# Altium footprint library SwagePCB.PcbLib: 114 footprints (part 5 of 8)
Each footprint in its own frame and in the unit in brackets; x right, y up, seen from the top. Pads: shape width x height; smd on the part's side, far side on the other; paste and mask are expansions set on the pad; w line width, h text height; cw(c..) or ccw(c..) is an arc to the next point about the centre after c.
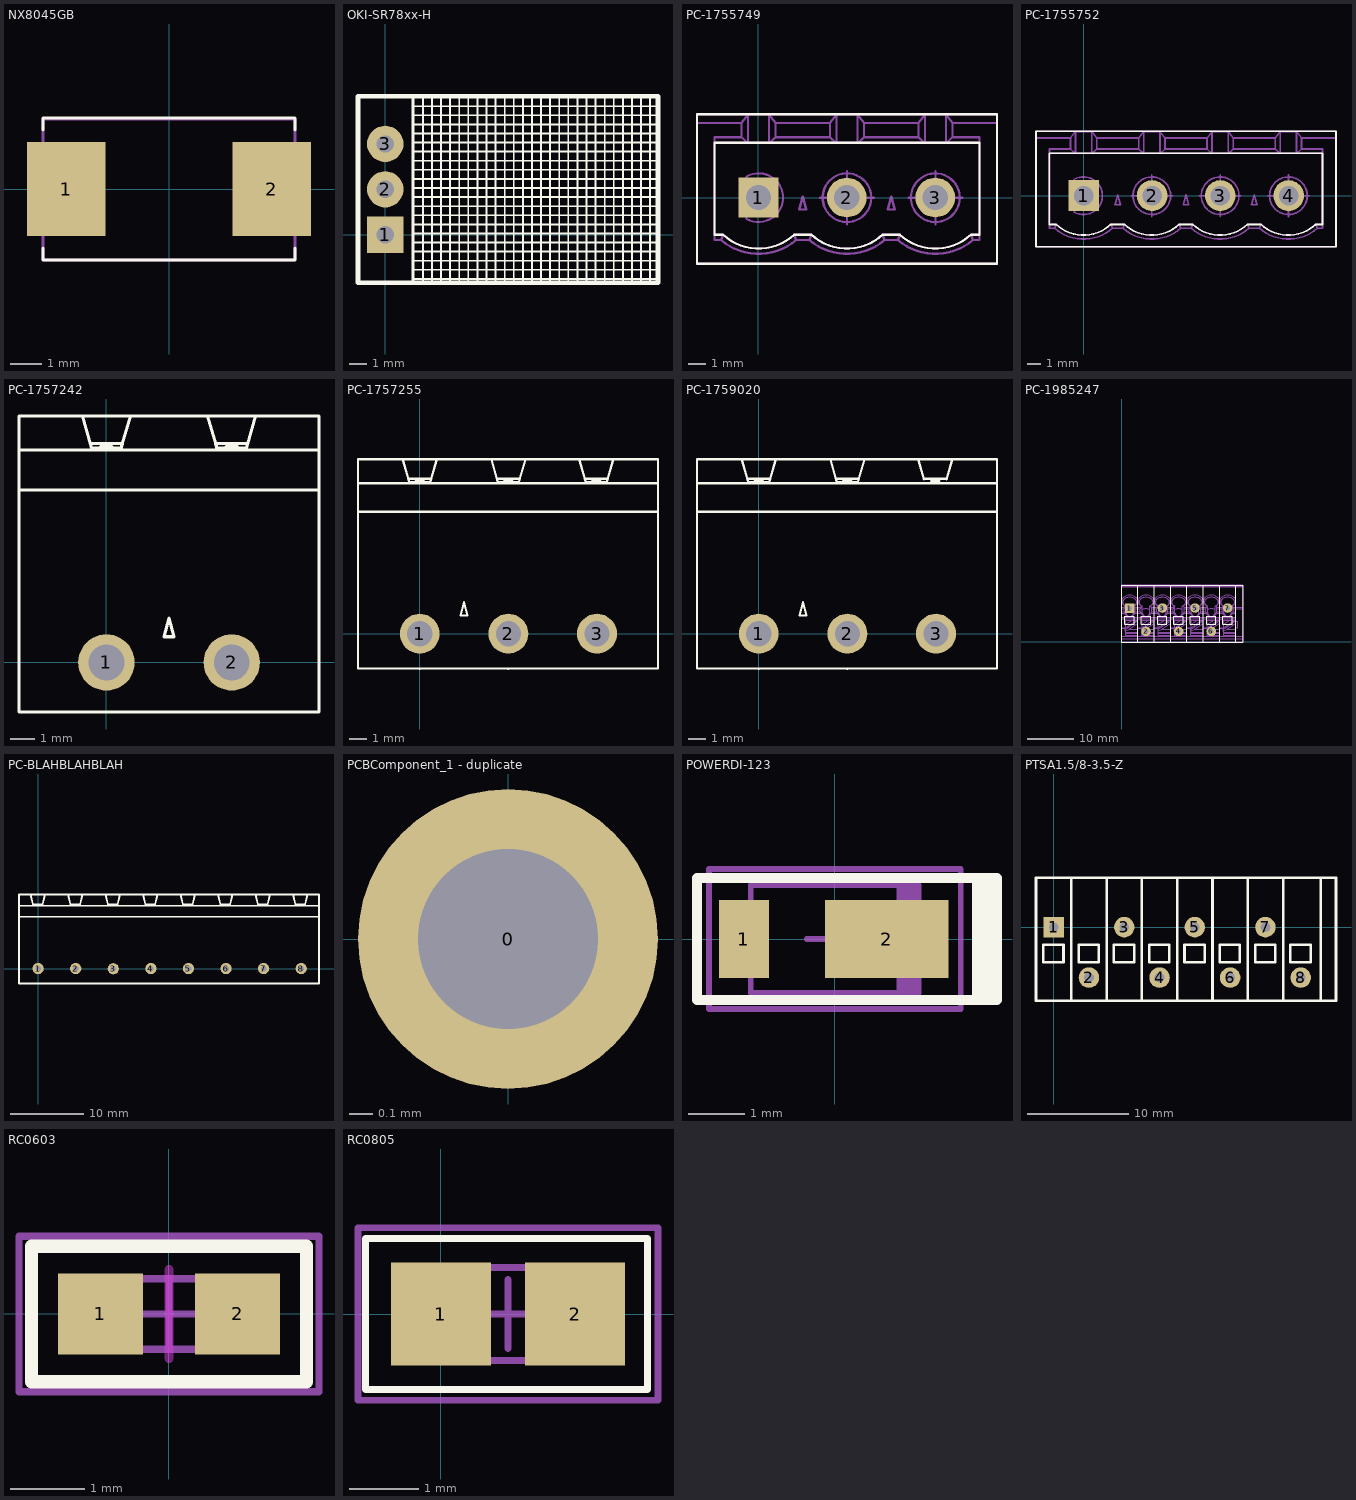
[diagram p4: the footprints below, top view; thin cyan lines are the x and y axes]

## NX8045GB [mm] "Crystal, 8MHz, SMD"
height 2
pads (2):
  rect 2.5x3 smd: 1(-3.263,0) 2(3.263,0)
Top Overlay:
  lines w0.102: -4,-1.875 -4,-2.25 4,-2.25 4,-1.875 ; -4,1.875 -4,2.25 4,2.25 4,1.875
Mechanical 13:
  lines w0.102: -4,-2.25 4,-2.25 ; -4,-2.25 -4,2.225 4,2.225 4,-2.25 ; -4,-2.25 4,-2.25
3D body: height 2, standoff 0.1, extent -4,-2.25 4,2.225

## OKI-SR78xx-H [mil] "Regulator, 3 Terminal, Switching, Horizontal Mount"
pads (3):
  rect 80x80 hole 38: 1(0,0)
  round 80 hole 38: 2(0,100) 3(0,200)
Top Overlay:
  lines w4: 60,-105 60,305 ; 60,-97 600,-97 ; 60,-77 600,-77 ; 60,-57 600,-57 ; 60,-37 600,-37 ; 60,-17 600,-17 ; 60,3 600,3 ; 60,23 600,23 ; 60,43 600,43 ; 60,63 600,63 ; 60,83 600,83 ; 60,103 600,103 ; 60,123 600,123 ; 60,143 600,143 ; 60,163 600,163 ; 60,183 600,183 ; 60,203 600,203 ; 60,223 600,223 ; 60,243 600,243 ; 60,263 600,263 ; 60,283 600,283 ; 60,303 600,303 ; 62.73,-103.44 62.73,306.56 ; 82.73,-103.44 82.73,306.56 ; 102.73,-103.44 102.73,306.56 ; 122.73,-103.44 122.73,306.56 ; 142.73,-103.44 142.73,306.56 ; 162.73,-103.44 162.73,306.56 ; 182.73,-103.44 182.73,306.56 ; 202.73,-103.44 202.73,306.56 ; 222.73,-103.44 222.73,306.56 ; 242.73,-103.44 242.73,306.56 ; 262.73,-103.44 262.73,306.56 ; 282.73,-103.44 282.73,306.56 ; 302.73,-103.44 302.73,306.56 ; 322.73,-103.44 322.73,306.56 ; 342.73,-103.44 342.73,306.56 ; 362.73,-103.44 362.73,306.56 ; 382.73,-103.44 382.73,306.56 ; 402.73,-103.44 402.73,306.56 ; 422.73,-103.44 422.73,306.56 ; 442.73,-103.44 442.73,306.56 ; 462.73,-103.44 462.73,306.56 ; 482.73,-103.44 482.73,306.56 ; 502.73,-103.44 502.73,306.56 ; 522.73,-103.44 522.73,306.56 ; 542.73,-103.44 542.73,306.56 ; 562.73,-103.44 562.73,306.56 ; 582.73,-103.44 582.73,306.56 ; 60,-103.44 600,-103.44 600,306.56 60,306.56 60,-103.44
  lines w10: -60,-105 600,-105 600,305 -60,305 -60,-105
3D body: height 300.47, standoff -169.53, extent -50,-105 600,305

## PC-1755749 [mil] "Connector, Phoenix Contact, 3 Position"
pads (3):
  rect 90x90 hole 57: 1(0,0)
  round 90 hole 57: 2(200,0) 3(400,0)
Top Overlay:
  lines w5: -24.98,124.15 -99.63,124.15 -99.63,-84.25 -79.93,-84.25 ccw(c0.37,2.36) 80.67,-84.25 120.07,-84.25 ccw(c200.37,2.36) 280.67,-84.25 320.07,-84.25 ccw(c400.37,2.36) 480.67,-84.25 500.37,-84.25 500.37,124.15 425.73,124.15 ; -23.45,124.15 24.19,124.15 ; 25.72,124.15 175.02,124.15 ; 176.55,124.15 224.19,124.15 ; 225.72,124.15 375.02,124.15 ; 376.55,124.15 424.19,124.15 ; -139,-150 539.74,-150 539.74,168.9 539.74,188.58 -139,188.58 -139,168.9 -139,-150
Mechanical 3:
  drawing of 723 lines, arcs and shapes, not listed
3D body: height 472.44, standoff -153.54, extent -139.37,-150 539.37,188.58

## PC-1755752 [mil] "Connector, Phoenix Contact, 4 Positions"
pads (4):
  rect 90x90 hole 57: 1(0,0)
  round 90 hole 57: 2(200,0) 3(400,0) 4(600,0)
Top Overlay:
  lines w5: -26.35,124 -101,124 -101,-84.4 -81.3,-84.4 ccw(c-1,2.21) 79.3,-84.4 118.7,-84.4 ccw(c199,2.21) 279.3,-84.4 318.7,-84.4 ccw(c399,2.21) 479.3,-84.4 518.7,-84.4 ccw(c599,2.21) 679.3,-84.4 699,-84.4 699,124 624.36,124 ; -24.82,124 22.82,124 ; 24.35,124 173.65,124 ; 175.18,124 222.82,124 ; 224.35,124 373.65,124 ; 375.18,124 422.82,124 ; 424.36,124 573.65,124 ; 575.18,124 622.82,124 ; -140,-150 -140,168.9 -140,188.58 738.74,188.58 738.74,168.9 738.74,-150 -140,-150
Mechanical 2:
  lines w5: 138.74,-0.39 260,-0.39 138.74,-0.39 ; 199.37,-61.02 199.37,60.24 199.37,-61.02 ; 338.74,-0.39 460,-0.39 338.74,-0.39 ; 399.37,-61.02 399.37,60.24 399.37,-61.02 ; 538.74,-0.39 660,-0.39 538.74,-0.39 ; 599.37,-61.02 599.37,60.24 599.37,-61.02
Mechanical 3:
  drawing of 925 lines, arcs and shapes, not listed
3D body: height 472.44, standoff -153.54, extent -140,-149.29 738.74,189.29

## PC-1757242 [mil] "Connector, 2 Pin, Right Angle, Phoenix Contact, PTH"
pads (2):
  round 90 hole 57: 1(0,0) 2(200,0)
Top Overlay:
  lines w5: -25.97,349.36 25.71,349.36 ; -9.79,342.26 -9.27,344.23 9.01,344.23 9.53,342.26 ; -1.99,-79 ccw(c-0.13,-59.44) 1.73,-79 ; 174.03,349.36 225.71,349.36 ; 190.21,342.26 190.73,344.23 209.01,344.23 209.53,342.26 ; 198.01,-79 ccw(c199.87,-59.44) 201.73,-79 ; -139.5,275.33 -139.5,52.89 -139.5,45.01 -139.5,40.11 -139.5,34.2 -139.5,15.93 -139.5,8.89 -139.5,7.39 -139.5,6.31 -139.5,2.98 -139.5,-5.28 -139.5,-8.61 -139.5,-9.69 -139.5,-11.19 -139.5,-11.66 -139.5,-18.23 -139.5,-47.24 -139.5,-51.43 -139.5,-59.31 -139.5,-79 -59.19,-79 58.93,-79 140.82,-79 258.93,-79 339.24,-79 339.24,41.08 339.24,70.61 339.24,275.33 ; -139.5,275.33 -139.5,339.36 ; -139.5,275.33 339.24,275.33 ; -139.5,339.36 339.24,339.36 ; -139.5,339.36 -139.5,393.44 -100.13,393.44 -84.94,393.44 -38.52,393.44 ; -38.52,393.44 -25.48,347.66 -23.95,342.26 23.69,342.26 25.22,347.66 38.26,393.44 ; -38.52,393.44 38.26,393.44 ; 38.26,393.44 84.68,393.44 115.06,393.44 161.48,393.44 ; 161.48,393.44 238.26,393.44 ; 161.48,393.44 174.52,347.66 176.05,342.26 223.69,342.26 225.22,347.66 238.26,393.44 ; 238.26,393.44 284.68,393.44 299.87,393.44 339.24,393.44 339.24,339.36 ; 339.24,275.33 339.24,339.36 ; 91.96,41.08 99.87,70.61 107.78,41.08 91.96,41.08
3D body: height 338.58, standoff -137.8, extent -139.87,-79.25 338.87,393.28

## PC-1757255 [mil] "Connector, 3 Pin, Right Angle, Phoenix Contact, PTH"
height 338.58
pads (3):
  round 90 hole 57: 1(0,0) 2(200,0) 3(400,0)
Top Overlay:
  lines w5: -25.97,349.36 25.71,349.36 ; -9.79,342.26 -9.27,344.23 9.01,344.23 9.53,342.26 ; -1.99,-79 ccw(c-0.13,-59.44) 1.73,-79 ; 174.03,349.36 225.71,349.36 ; 190.21,342.26 190.73,344.23 209.01,344.23 209.53,342.26 ; 198.01,-79 ccw(c199.87,-59.44) 201.73,-79 ; 313.49,393.44 359.91,393.44 ; 339.06,-79 457.17,-79 537.48,-79 ; 339.24,-79 258.93,-79 140.82,-79 58.93,-79 -59.19,-79 -139.5,-79 -139.5,-59.31 -139.5,-51.43 -139.5,-47.24 -139.5,-18.23 -139.5,-11.66 -139.5,-11.19 -139.5,-9.69 -139.5,-8.61 -139.5,-5.28 -139.5,2.98 -139.5,6.31 -139.5,7.39 -139.5,8.89 -139.5,15.93 -139.5,34.2 -139.5,40.11 -139.5,45.01 -139.5,52.89 -139.5,275.33 ; 339.24,393.44 299.87,393.44 284.68,393.44 238.26,393.44 ; 372.46,349.36 424.14,349.36 ; 388.63,342.26 389.16,344.23 407.43,344.23 407.96,342.26 ; 537.67,-79 537.67,41.08 537.67,70.61 537.67,275.33 ; -139.5,275.33 -139.5,339.36 ; -139.5,275.33 537.67,275.33 ; -139.5,339.36 -139.5,393.44 -100.13,393.44 -84.94,393.44 -38.52,393.44 ; -139.5,339.36 537.67,339.36 ; -38.52,393.44 38.26,393.44 ; -38.52,393.44 -25.48,347.66 -23.95,342.26 23.69,342.26 25.22,347.66 38.26,393.44 ; 38.26,393.44 84.68,393.44 115.06,393.44 161.48,393.44 ; 161.48,393.44 174.52,347.66 176.05,342.26 223.69,342.26 225.22,347.66 238.26,393.44 ; 161.48,393.44 238.26,393.44 ; 359.91,393.44 436.68,393.44 ; 359.91,393.44 372.94,347.66 374.48,342.26 422.11,342.26 423.65,347.66 436.68,393.44 ; 436.68,393.44 483.1,393.44 498.3,393.44 537.67,393.44 537.67,339.36 ; 537.67,275.33 537.67,339.36 ; 91.96,41.08 107.78,41.08 99.87,70.61 91.96,41.08
3D body: height 338.58, standoff -137.8, extent -137.64,-79 541.1,393.53

## PC-1759020 [mil] "Connector, 3 Pin, Right Angle, Phoenix Contact, PTH"
height 338.58
pads (3):
  round 90 hole 57: 1(0,0) 2(200,0) 3(400,0)
Top Overlay:
  lines w5: -25.97,349.36 25.71,349.36 ; -9.79,342.26 -9.27,344.23 9.01,344.23 9.53,342.26 ; -1.99,-79 ccw(c-0.13,-59.44) 1.73,-79 ; 174.03,349.36 225.71,349.36 ; 190.21,342.26 190.73,344.23 209.01,344.23 209.53,342.26 ; 198.01,-79 ccw(c199.87,-59.44) 201.73,-79 ; 313.49,393.44 359.91,393.44 ; 339.06,-79 457.17,-79 537.48,-79 ; 339.24,-79 258.93,-79 140.82,-79 58.93,-79 -59.19,-79 -139.5,-79 -139.5,-59.31 -139.5,-51.43 -139.5,-47.24 -139.5,-18.23 -139.5,-11.66 -139.5,-11.19 -139.5,-9.69 -139.5,-8.61 -139.5,-5.28 -139.5,2.98 -139.5,6.31 -139.5,7.39 -139.5,8.89 -139.5,15.93 -139.5,34.2 -139.5,40.11 -139.5,45.01 -139.5,52.89 -139.5,275.33 ; 339.24,393.44 299.87,393.44 284.68,393.44 238.26,393.44 ; 372.46,349.36 424.14,349.36 ; 372.94,347.66 359.91,393.44 ; 389.16,344.23 407.43,344.23 ; 423.65,347.66 436.68,393.44 ; 537.67,-79 537.67,41.08 537.67,70.61 537.67,275.33 ; -139.5,275.33 537.67,275.33 ; -139.5,275.33 -139.5,339.36 ; -139.5,339.36 537.67,339.36 ; -139.5,339.36 -139.5,393.44 -100.13,393.44 -84.94,393.44 -38.52,393.44 ; -38.52,393.44 -25.48,347.66 -23.95,342.26 23.69,342.26 25.22,347.66 38.26,393.44 ; -38.52,393.44 38.26,393.44 ; 38.26,393.44 84.68,393.44 115.06,393.44 161.48,393.44 ; 161.48,393.44 238.26,393.44 ; 161.48,393.44 174.52,347.66 176.05,342.26 223.69,342.26 225.22,347.66 238.26,393.44 ; 359.91,393.44 436.68,393.44 ; 436.68,393.44 483.1,393.44 498.3,393.44 537.67,393.44 537.67,339.36 ; 537.67,275.33 537.67,339.36 ; 91.96,41.08 99.87,70.61 107.78,41.08 91.96,41.08
3D body: height 338.58, standoff -137.8, extent -101.99,-79 498.01,393.53

## PC-1985247 [mil] "Connector, Spring, 7 positions"
pads (7):
  rect 80x80 hole 38: 1(68.9,285.59)
  round 80 hole 38: 2(206.69,88.74) 3(344.49,285.59) 4(482.28,88.74) 5(620.08,285.59) 6(757.87,88.74) 7(895.67,285.59)
Top Overlay:
  lines w10: 137.8,-1.81 137.8,478.51 ; 275.59,-1.81 275.59,478.51 ; 413.39,-1.81 413.39,478.51 ; 551.18,-1.81 551.18,478.51 ; 688.98,-1.81 688.98,478.51 ; 826.77,-1.81 826.77,478.51 ; 964.57,-1.81 964.57,478.51 ; 1023.62,-1.81 0,-1.81 0,478.51 1023.62,478.51 ; 1025.83,-1.81 1025.83,478.51 ; 28.54,148.78 107.28,148.78 107.28,217.68 28.54,217.68 28.54,148.78 ; 166.34,148.78 166.34,217.68 245.08,217.68 245.08,148.78 166.34,148.78 ; 304.13,148.78 304.13,217.68 382.87,217.68 382.87,148.78 304.13,148.78 ; 441.93,148.78 441.93,217.68 520.67,217.68 520.67,148.78 441.93,148.78 ; 579.72,148.78 579.72,217.68 658.46,217.68 658.46,148.78 579.72,148.78 ; 717.52,148.78 717.52,217.68 796.26,217.68 796.26,148.78 717.52,148.78 ; 855.32,148.78 855.32,217.68 934.06,217.68 934.06,148.78 855.32,148.78
Mechanical 3:
  drawing of 1178 lines, arcs and shapes, not listed
Mechanical 13:
  lines w3.94: 0,-1.79 1023.62,-1.79 1023.62,480.49 0,480.49 0,-1.81
3D body: height 515.75, standoff -137.8, extent 0,0 1023.62,472.44

## PC-BLAHBLAHBLAH [mil]
pads (8):
  round 60 hole 30: 1(0,0) 2(200,0) 3(400,-1) 4(600,0) 5(800,0) 6(1000,0) 7(1200,0) 8(1400,0)
Top Overlay:
  lines w9.98: -27.61,342.47 -21.98,342.47 ; -21.98,334.6 -21.98,342.47 ; -14.13,334.6 -14.13,342.47 ; 9.44,334.6 9.44,342.47 ; 17.3,334.6 17.3,342.47 ; 23.71,342.47 17.3,342.47 ; 171.93,342.47 177.56,342.47 ; 177.56,334.6 177.56,342.47 ; 185.42,334.6 185.42,342.47 ; 208.99,334.6 208.99,342.47 ; 216.84,334.6 216.84,342.47 ; 223.26,342.47 216.84,342.47 ; 371.47,342.47 377.1,342.47 ; 377.1,334.6 377.1,342.47 ; 384.96,334.6 384.96,342.47 ; 408.53,334.6 408.53,342.47 ; 416.38,334.6 416.38,342.47 ; 422.8,342.47 416.38,342.47 ; 571.02,342.47 576.65,342.47 ; 576.65,334.6 576.65,342.47 ; 584.5,334.6 584.5,342.47 ; 608.07,334.6 608.07,342.47 ; 615.93,334.6 615.93,342.47 ; 622.34,342.47 615.93,342.47 ; 770.56,342.47 776.19,342.47 ; 776.19,334.6 776.19,342.47 ; 784.05,334.6 784.05,342.47 ; 807.61,334.6 807.61,342.47 ; 815.47,334.6 815.47,342.47 ; 821.89,342.47 815.47,342.47 ; 970.1,342.47 975.73,342.47 ; 975.73,334.6 975.73,342.47 ; 983.59,334.6 983.59,342.47 ; 1007.16,334.6 1007.16,342.47 ; 1015.01,334.6 1015.01,342.47 ; 1021.43,342.47 1015.01,342.47 ; 1169.64,342.47 1175.28,342.47 ; 1175.28,334.6 1175.28,342.47 ; 1183.13,334.6 1183.13,342.47 ; 1206.7,334.6 1206.7,342.47 ; 1214.56,334.6 1214.56,342.47 ; 1220.97,342.47 1214.56,342.47 ; 1369.19,342.47 1374.82,342.47 ; 1374.82,334.6 1374.82,342.47 ; 1382.67,334.6 1382.67,342.47 ; 1406.24,334.6 1406.24,342.47 ; 1414.1,334.6 1414.1,342.47 ; 1420.51,342.47 1414.1,342.47 ; -101.72,275.55 -101.72,334.6 ; -101.72,275.55 1494.62,275.55 ; -101.72,275.55 -101.72,-78.74 1494.62,-78.74 1494.62,275.55 ; -101.72,334.6 -25.52,334.6 ; -101.72,334.6 -101.72,393.64 -41.23,393.64 ; -41.23,393.64 -25.52,334.6 ; -41.23,393.64 37.33,393.64 ; -25.52,334.6 21.62,334.6 ; -21.98,342.47 -14.13,342.47 ; -14.13,342.47 9.44,342.47 ; 9.44,342.47 17.3,342.47 ; 21.62,334.6 174.03,334.6 ; 21.62,334.6 37.33,393.64 ; 37.33,393.64 158.31,393.64 ; 158.31,393.64 174.03,334.6 ; 158.31,393.64 236.87,393.64 ; 174.03,334.6 221.16,334.6 ; 177.56,342.47 185.42,342.47 ; 185.42,342.47 208.99,342.47 ; 208.99,342.47 216.84,342.47 ; 221.16,334.6 373.57,334.6 ; 221.16,334.6 236.87,393.64 ; 236.87,393.64 357.86,393.64 ; 357.86,393.64 373.57,334.6 ; 357.86,393.64 436.42,393.64 ; 373.57,334.6 420.7,334.6 ; 377.1,342.47 384.96,342.47 ; 384.96,342.47 408.53,342.47 ; 408.53,342.47 416.38,342.47 ; 420.7,334.6 573.11,334.6 ; 420.7,334.6 436.42,393.64 ; 436.42,393.64 557.4,393.64 ; 557.4,393.64 573.11,334.6 ; 557.4,393.64 635.96,393.64 ; 573.11,334.6 620.25,334.6 ; 576.65,342.47 584.5,342.47 ; 584.5,342.47 608.07,342.47 ; 608.07,342.47 615.93,342.47 ; 620.25,334.6 772.65,334.6 ; 620.25,334.6 635.96,393.64 ; 635.96,393.64 756.94,393.64 ; 756.94,393.64 772.65,334.6 ; 756.94,393.64 835.5,393.64 ; 772.65,334.6 819.79,334.6 ; 776.19,342.47 784.05,342.47 ; 784.05,342.47 807.61,342.47 ; 807.61,342.47 815.47,342.47 ; 819.79,334.6 972.2,334.6 ; 819.79,334.6 835.5,393.64 ; 835.5,393.64 956.49,393.64 ; 956.49,393.64 972.2,334.6 ; 956.49,393.64 1035.05,393.64 ; 972.2,334.6 1019.33,334.6 ; 975.73,342.47 983.59,342.47 ; 983.59,342.47 1007.16,342.47 ; 1007.16,342.47 1015.01,342.47 ; 1019.33,334.6 1171.74,334.6 ; 1019.33,334.6 1035.05,393.64 ; 1035.05,393.64 1156.03,393.64 ; 1156.03,393.64 1171.74,334.6 ; 1156.03,393.64 1234.59,393.64 ; 1171.74,334.6 1218.88,334.6 ; 1175.28,342.47 1183.13,342.47 ; 1183.13,342.47 1206.7,342.47 ; 1206.7,342.47 1214.56,342.47 ; 1218.88,334.6 1371.28,334.6 ; 1218.88,334.6 1234.59,393.64 ; 1234.59,393.64 1355.57,393.64 ; 1355.57,393.64 1371.28,334.6 ; 1355.57,393.64 1434.13,393.64 ; 1371.28,334.6 1418.42,334.6 ; 1374.82,342.47 1382.67,342.47 ; 1382.67,342.47 1406.24,342.47 ; 1406.24,342.47 1414.1,342.47 ; 1418.42,334.6 1494.62,334.6 ; 1418.42,334.6 1434.13,393.64 ; 1434.13,393.64 1494.62,393.64 1494.62,334.6 ; 1494.62,275.55 1494.62,334.6
Mechanical 2:
  lines w9.98: -20.54,-10.98 -20.54,12.64 ; -18.8,-11.16 cw(c-11.8,-11.86) -12.69,-18.84 10.88,-18.85 cw(c11.73,-11.86) 18.71,-10.98 ; -18.8,12.48 ccw(c-11.8,11.82) -12.51,18.82 ; -12.69,20.51 10.88,20.51 ; 11.05,18.82 ccw(c11.73,11.82) 18.72,12.64 ; 18.74,-10.98 18.74,12.64 ; 179,-10.98 179,12.64 ; 180.7,-11.15 cw(c187.7,-11.86) 186.86,-18.85 210.43,-18.85 ; 180.7,12.48 ccw(c187.7,11.82) 187.02,18.82 ; 186.86,20.51 210.43,20.51 ; 210.42,-18.82 cw(c211.29,-11.86) 218.24,-10.99 ; 210.59,18.8 ccw(c211.29,11.82) 218.25,12.63 ; 218.28,-10.98 218.28,12.64 ; 378.54,-10.98 378.54,12.64 ; 380.31,-11.16 cw(c387.31,-11.86) 386.4,-18.84 409.97,-18.85 cw(c410.84,-11.86) 417.82,-10.98 417.82,12.64 ; 380.3,12.48 ccw(c387.31,11.82) 386.58,18.82 ; 386.4,20.51 409.97,20.51 ; 410.14,18.82 ccw(c410.84,11.82) 417.83,12.64 ; 578.09,-10.98 578.09,12.64 ; 579.81,-11.16 cw(c586.81,-11.86) 585.94,-18.84 609.51,-18.85 cw(c610.34,-11.86) 617.32,-10.99 ; 579.8,12.48 ccw(c586.81,11.82) 586.11,18.82 ; 585.94,20.51 609.51,20.51 ; 609.67,18.83 ccw(c610.34,11.82) 617.33,12.63 617.37,-10.98 ; 777.63,-10.98 777.63,12.64 ; 779.31,-11.15 cw(c786.31,-11.86) 785.48,-18.85 809.05,-18.85 cw(c809.94,-11.86) 816.92,-10.98 816.91,12.64 ; 779.3,12.48 ccw(c786.31,11.82) 785.64,18.83 ; 785.49,20.51 809.05,20.51 ; 809.23,18.82 ccw(c809.94,11.82) 816.93,12.64 ; 977.17,-10.98 977.17,12.64 ; 978.91,-11.16 cw(c985.91,-11.86) 985.03,-18.84 1008.6,-18.85 cw(c1009.45,-11.86) 1016.43,-10.99 1016.45,12.64 cw(c1009.45,11.82) 1008.76,18.82 ; 978.91,12.48 ccw(c985.91,11.82) 985.2,18.82 ; 985.03,20.51 1008.6,20.51 ; 1176.72,-10.98 1176.72,12.64 ; 1178.41,-11.15 cw(c1185.41,-11.86) 1184.57,-18.85 1208.14,-18.85 cw(c1209.05,-11.86) 1216.03,-10.98 ; 1178.41,12.48 ccw(c1185.41,11.82) 1184.73,18.82 ; 1184.57,20.51 1208.14,20.51 ; 1208.32,18.82 ccw(c1209.05,11.82) 1216.04,12.64 ; 1216,-10.98 1216,12.64 ; 1376.26,-10.98 1376.26,12.64 ; 1378.02,-11.16 cw(c1385.02,-11.86) 1384.11,-18.84 1407.68,-18.85 cw(c1408.55,-11.86) 1415.53,-10.98 1415.54,12.64 cw(c1408.55,11.82) 1407.85,18.82 ; 1378.01,12.48 ccw(c1385.02,11.82) 1384.29,18.82 ; 1384.11,20.51 1407.68,20.51

## PCBComponent_1 [mm]

## PCBComponent_1 - duplicate [mil]
pads (1):
  round 50 hole 30: 0(0,0)

## PCBComponent_1 - duplicate1 [mm]

## POWERDI-123 [mm] "Molded Diode, DFLS1200, 2-Leads, Body 2.8x1.8mm, IPC Medium Density"
height 1
pads (2):
  rect 0.9x1.4 smd: 1(-1.625,0)
  rect 2.2x1.4 smd: 2(0.925,0)
Top Overlay:
  lines w0.178: 2.54,-1.092 2.54,1.092 ; 2.692,1.092 2.896,1.092 2.896,-1.092 2.718,-1.092 -2.464,-1.092 -2.464,1.092 2.54,1.092 ; 2.718,-1.041 2.718,1.092 2.54,1.092
Mechanical 13:
  rectangle: 1.097,-0.965 1.5,0.965
  lines w0.1: -1.5,-0.965 -1.5,0.965 1.5,0.965 1.5,-0.965 -1.5,-0.965
Mechanical 15:
  lines w0.1: -0.5,0 0.5,0 ; 0,-0.5 0,0.5 ; -2.25,-1.25 -2.25,1.25 2.25,1.25 2.25,-1.25 -2.25,-1.25
3D body: height 1, standoff 0, extent -1.5,-0.965 1.5,0.965

## PTSA1.5/8-3.5-Z [mil] "Connector, ZIF, PC-1985250,"
height 515.75
pads (8):
  rect 80x80 hole 38: 1(0,0)
  round 80 hole 38: 2(137.8,-196.85) 3(275.59,0) 4(413.39,-196.85) 5(551.18,0) 6(688.98,-196.85) 7(826.77,0) 8(964.57,-196.85)
Top Overlay:
  lines w10: 68.9,-287.4 68.9,192.91 ; 206.69,-287.4 206.69,192.91 ; 344.49,-287.4 344.49,192.91 ; 482.28,-287.4 482.28,192.91 ; 620.08,-287.4 620.08,192.91 ; 757.87,-287.4 757.87,192.91 ; 895.67,-287.4 895.67,192.91 ; 1043.31,-287.4 1043.31,192.91 ; -68.9,-287.4 -68.9,192.91 1102.36,192.91 1102.36,-287.4 -68.9,-287.4 ; -40.35,-136.81 -40.35,-67.91 38.39,-67.91 38.39,-136.81 -40.35,-136.81 ; 97.44,-136.81 176.18,-136.81 176.18,-67.91 97.44,-67.91 97.44,-136.81 ; 235.24,-136.81 313.98,-136.81 313.98,-67.91 235.24,-67.91 235.24,-136.81 ; 373.03,-136.81 451.77,-136.81 451.77,-67.91 373.03,-67.91 373.03,-136.81 ; 510.83,-136.81 589.57,-136.81 589.57,-67.91 510.83,-67.91 510.83,-136.81 ; 648.62,-136.81 727.36,-136.81 727.36,-67.91 648.62,-67.91 648.62,-136.81 ; 786.42,-136.81 865.16,-136.81 865.16,-67.91 786.42,-67.91 786.42,-136.81 ; 924.21,-136.81 1002.95,-136.81 1002.95,-67.91 924.21,-67.91 924.21,-136.81
Mechanical 13:
  lines w3.94: -68.9,-287.4 -68.9,194.9 1102.36,194.9 1102.36,-287.39 -68.9,-287.39
3D body: height 515.75, standoff -137.8, extent -68.9,-287.4 1092.52,185.04

## RC0603 [mm] "Resistor, Capacitor, 0603"
height 0.55
pads (2):
  rect 1.15x1.1 smd: 1(-0.925,0) 2(0.925,0)
Top Layer keep-out:
  lines w0.127: 0,-0.6 0,0.6
Top Overlay:
  lines w0.178: -1.854,-0.914 1.854,-0.914 1.854,0.914 -1.854,0.914 -1.854,-0.914
Mechanical 13:
  lines w0.1: -0.875,-0.475 0.875,-0.475 0.875,0.475 -0.875,0.475 -0.875,-0.475
Mechanical 15:
  lines w0.1: -0.475,0 0.475,0 ; 0,-0.475 0,0.475 ; -2.025,-1.05 2.025,-1.05 2.025,1.05 -2.025,1.05 -2.025,-1.05
3D body: height 0.55, standoff 0, extent -0.875,-0.475 0.875,0.475

## RC0805 [mm]
height 0.5
pads (2):
  rect 1.45x1.5 smd: 1(0,0) 2(1.95,0)
Top Overlay:
  lines w0.102: -1.092,-1.092 -1.092,1.092 2.997,1.092 2.997,-1.092 -1.092,-1.092
Mechanical 13:
  lines w0.1: -0.075,-0.675 2.025,-0.675 2.025,0.675 -0.075,0.675 -0.075,-0.675
Mechanical 15:
  lines w0.1: 0.475,0 1.475,0 ; 0.975,-0.5 0.975,0.5 ; -1.2,-1.25 3.15,-1.25 3.15,1.25 -1.2,1.25 -1.2,-1.25
3D body: height 0.5, standoff 0, extent -0.075,-0.675 2.025,0.675